# Altium footprint library Mine.PcbLib: 306 footprints (part 9 of 20)
Each footprint in its own frame and in the unit in brackets; x right, y up, seen from the top. Pads: shape width x height; smd on the part's side, far side on the other; paste and mask are expansions set on the pad; w line width, h text height; cw(c..) or ccw(c..) is an arc to the next point about the centre after c.
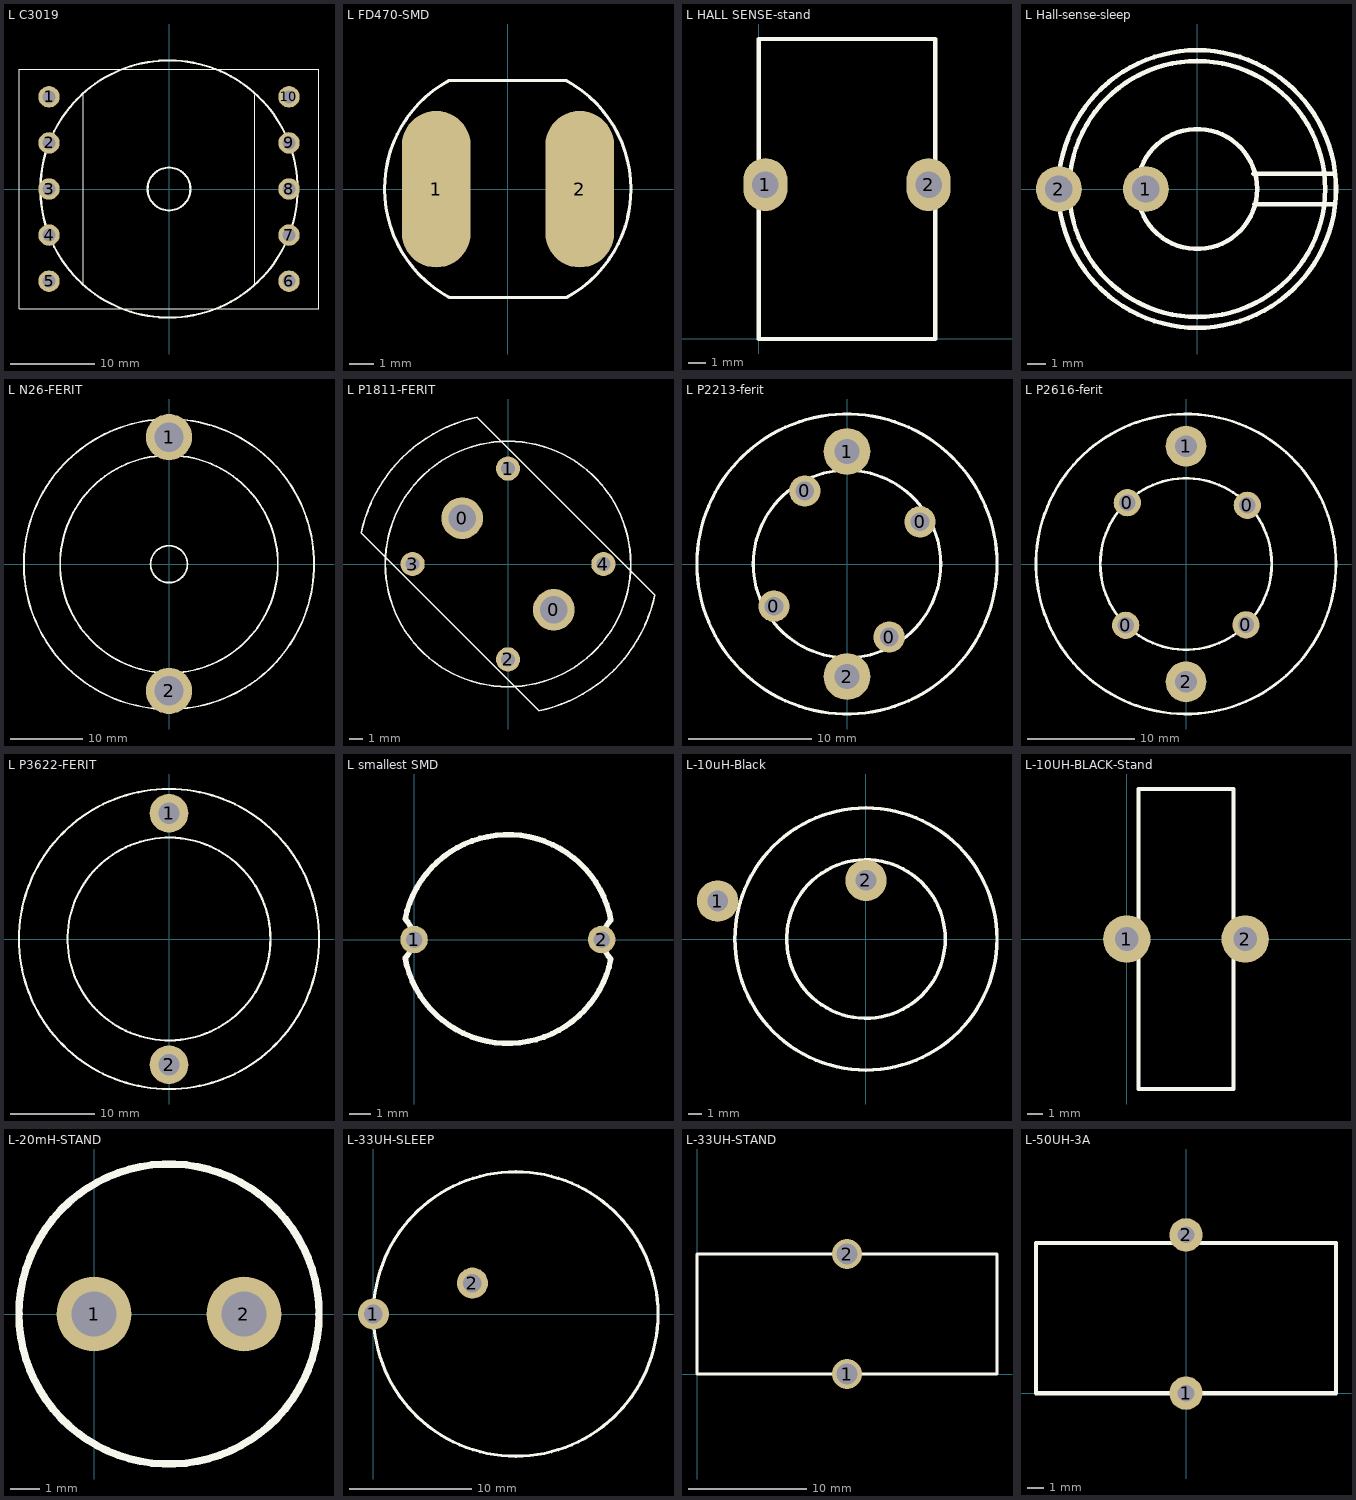
[diagram p8: the footprints below, top view; thin cyan lines are the x and y axes]

## L C3019 [mil]
height 800
pads (10):
  round 100 hole 60: 1(-560,430) 2(-560,215) 3(-560,0) 4(-560,-215) 5(-560,-430) 6(560,-430) 7(560,-215) 8(560,0) 9(560,215) 10(560,430)
Top Overlay:
  circle w10: c0,0 r600
  circle w10: c0,0 r100
  lines w5: -400,-440 -400,440 ; 400,-450 400,440 ; -700,-560 700,-560 700,560 -700,560 -700,-560

## L FD470-SMD [mil]
height 196.85
pads (2):
  oval 110x250 smd: 1(-114,0) 2(115,0)
Top Overlay:
  lines w5: -93.8,173.36 ccw(c0.22,0.42) -93.02,-172.95 94.02,-172.95 ccw(c0,0) 93.25,173.36 -93.8,173.36

## L HALL SENSE-stand [mil]
pads (2):
  oval 100x120 hole 60: 1(15,349) 2(385,349)
Top Overlay:
  lines w10: 0,-1 400,-1 400,679 0,679 0,-1

## L Hall-sense-sleep [mil]
pads (2):
  round 100 hole 60: 1(-112,0) 2(-302,0)
Top Overlay:
  circle w10: c0,0 r303.15
  circle w10: c0,0 r131
  circle w10: c0,0 r279.53
  lines w10: 123,33 301,33 ; 125,-33 301,-33

## L N26-FERIT [mil]
pads (2):
  round 250 hole 160: 1(0,690) 2(0,-688)
Top Overlay:
  circle w10: c0,0 r100
  circle w10: c0,0 r590.55
  circle w10: c0,0 r787.4

## L P1811-FERIT [mil]
height 551.18
pads (6):
  round 120 hole 80: 0(-132.23,132.23) 0(132.23,-132.23)
  round 70 hole 40: 1(0,275.59) 2(0,-275.59) 3(-275.59,0) 4(275.59,0)
Top Overlay:
  circle w5: c0,0 r354.33
  lines w5: -423.69,89.64 cw(c0,0) -89.64,423.69 423.71,-89.65 cw(c0,0) 89.64,-423.69 -423.71,89.65

## L P2213-ferit [mil]
pads (6):
  round 100 hole 60: 0(-233.83,-135) 0(-135,233.83) 0(135,-233.83) 0(233.83,135)
  round 150 hole 80: 1(0,360) 2(0,-360)
Top Overlay:
  circle w10: c0,0 r480
  circle w10: c0,0 r300

## L P2616-ferit [mm]
height 19
pads (6):
  round 2.54 hole 1.524: 0(-5.625,-5.725) 0(-5.475,5.725) 0(5.6,-5.675) 0(5.725,5.475)
  round 3.81 hole 2.032: 1(0,11) 2(0,-11)
Top Overlay:
  circle w0.254: c0,0 r14
  circle w0.254: c0,0 r8

## L P3622-FERIT [mil]
pads (2):
  round 180 hole 100: 1(0,585.63) 2(0,-585.63)
Top Overlay:
  circle w10: c0,0 r472.44
  circle w10: c0,0 r698.82

## L smallest SMD [mil]
height 236.22
pads (2):
  round 50 hole 30: 1(0,0) 2(340,0)
Top Overlay:
  lines w10: -16.31,-33.38 ccw(c-51.63,1.94) -16.31,37.26 cw(c170,0) 356.69,35.32 ccw(c392.01,0) 356.69,-35.32 cw(c170.38,1.94) -16.31,-33.38

## L-10uH-Black [mil]
pads (2):
  round 120 hole 60: 1(-430,110) 2(0,170)
Top Overlay:
  circle w10: c0,0 r230
  circle w10: c0,0 r380

## L-10UH-BLACK-Stand [mil]
pads (2):
  round 120 hole 60: 1(0,0) 2(300,0)
Top Overlay:
  lines w10: 30,-380 270,-380 270,380 30,380 30,-380

## L-20mH-STAND [mil]
pads (2):
  round 100 hole 60: 1(0,0) 2(200,0)
Top Overlay:
  circle w10: c100,0 r200

## L-33UH-SLEEP [mil]
pads (2):
  round 100 hole 60: 1(0,0) 2(320,100)
Top Overlay:
  circle w10: c460,0 r460

## L-33UH-STAND [mil]
pads (2):
  round 100 hole 70: 1(500,0) 2(500,400)
Top Overlay:
  lines w10: 0,0 1000,0 1000,400 0,400 0,0

## L-50UH-3A [mil]
height 826.77
pads (2):
  round 80 hole 40: 1(0,0) 2(0,380)
Top Overlay:
  lines w10: -360,0 -360,360 360,360 360,0 -360,0